# Altium footprint library 我的器件.PCBLIB: 450 footprints (part 28 of 29)
Each footprint in its own frame and in the unit in brackets; x right, y up, seen from the top. Pads: shape width x height; smd on the part's side, far side on the other; paste and mask are expansions set on the pad; w line width, h text height; cw(c..) or ccw(c..) is an arc to the next point about the centre after c.
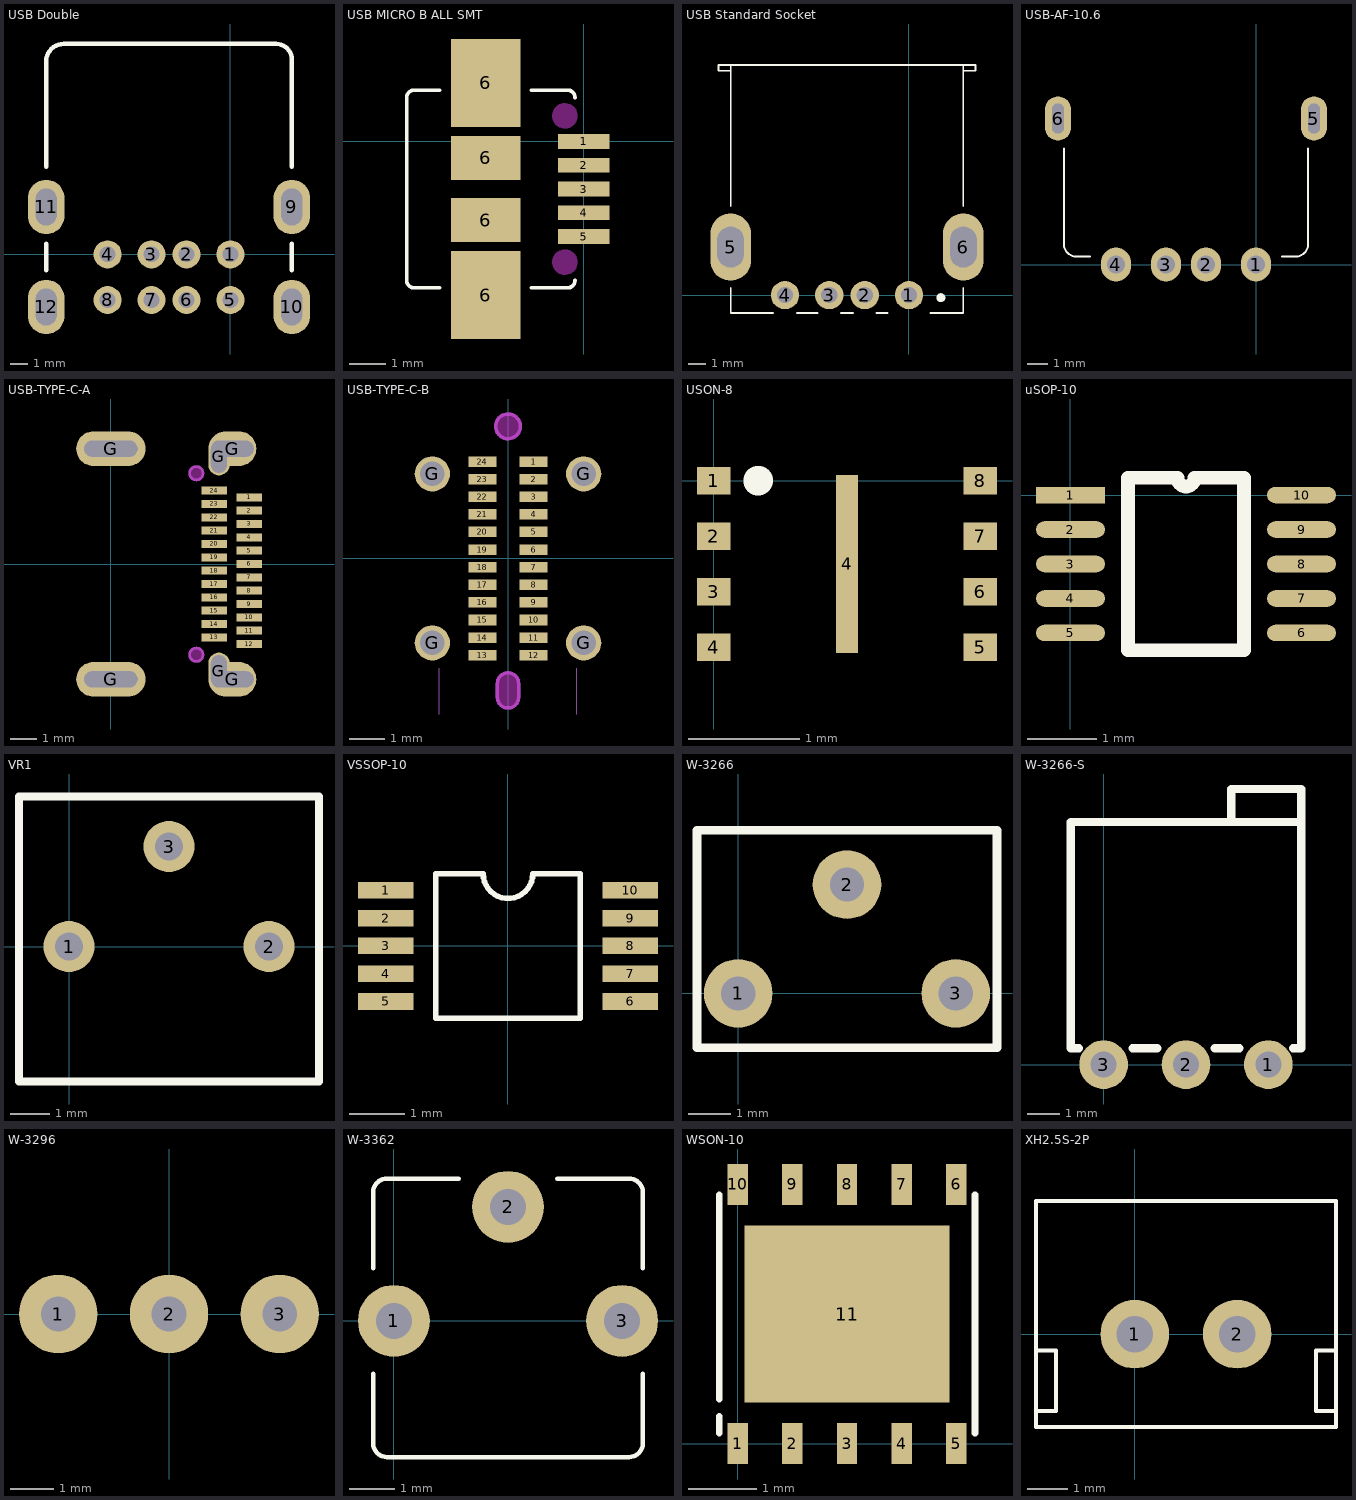
[diagram p27: the footprints below, top view; thin cyan lines are the x and y axes]

## USB Double [mm]
pads (12):
  round 1.6 hole 0.9: 1(0,0) 2(-2.5,0) 3(-4.5,0) 4(-7,0) 5(0,-2.6) 6(-2.5,-2.6) 7(-4.5,-2.6) 8(-7,-2.6)
  oval 2.1x3.1 hole 1.2 slot 2.1 at 90 deg: 9(3.5,2.7) 10(3.5,-3) 11(-10.5,2.7) 12(-10.5,-3)
Top Overlay:
  lines w0.254: -10.5,-0.9 -10.5,0.6 ; -10.5,5 -10.5,11 cw(c-9.5,11) -9.5,12 2.6,12 cw(c2.6,11.1) 3.5,11.1 3.5,5 ; 3.5,-0.9 3.5,0.6
3D body: height 0.6, standoff -2, extent 3.35,-3.8 3.65,-2.2
3D body: height 0.6, standoff -2, extent 3.35,1.9 3.65,3.5
3D body: height 0.6, standoff -2, extent -10.65,-3.8 -10.35,-2.2
3D body: height 0.6, standoff -2, extent -0.25,-0.1 0.25,0.1
3D body: height 0.6, standoff -2, extent -2.75,-0.1 -2.25,0.1
3D body: height 0.6, standoff -2, extent -4.75,-0.1 -4.25,0.1
3D body: height 0.6, standoff -2, extent -7.25,-0.1 -6.75,0.1
3D body: height 0.6, standoff -2, extent -0.25,-2.7 0.25,-2.5
3D body: height 0.6, standoff -2, extent -2.75,-2.7 -2.25,-2.5
3D body: height 0.6, standoff -2, extent -4.75,-2.7 -4.25,-2.5
3D body: height 0.6, standoff -2, extent -10.65,1.9 -10.35,3.5
3D body: height 4.1, standoff 3.6, extent -7.5,4.45 -6.5,10.45
3D body: height 6.1, standoff 4.1, extent -9,3.15 2,12.15
3D body: height 4.1, standoff 3.6, extent -5,4.45 -4,10.45
3D body: height 4.1, standoff 3.6, extent -3,4.45 -2,10.45
3D body: height 4.1, standoff 3.6, extent -0.5,4.45 0.5,10.45
3D body: height 12.8, standoff 12.3, extent -0.5,4.45 0.5,10.45
3D body: height 12.8, standoff 12.3, extent -3,4.45 -2,10.45
3D body: height 12.8, standoff 12.3, extent -5,4.45 -4,10.45
3D body: height 0.6, standoff 0, extent 0.5,5.05 1.5,10.35
3D body: height 0.6, standoff 0, extent -8.5,5.05 -7.5,10.35
3D body: height 17.1, standoff 0.6, extent 3.1,0.85 4.2,12.85
3D body: height 10.1, standoff 7.1, extent -11.2,0.85 4.2,12.85
3D body: height 17.1, standoff 15.8, extent -11.2,0.85 4.2,12.85
3D body: height 0.6, standoff -2, extent -7.25,-2.7 -6.75,-2.5
3D body: height 17.1, standoff 17, extent -11.2,-4.35 4.2,12.85
3D body: height 0.7, standoff 0.6, extent -11.2,-4.35 4.2,12.85
3D body: height 17.1, standoff 0.6, extent -11.2,-4.35 -11.1,12.85
3D body: height 17.1, standoff 0.6, extent 4.1,-4.35 4.2,12.85
3D body: height 17.1, standoff 0.6, extent -11.2,-4.35 4.2,-4.25
3D body: height 1.6, standoff 0.6, extent -11.2,0.85 4.2,12.85
3D body: height 17.1, standoff 0.6, extent -11.2,0.85 -10.1,12.85
3D body: height 17, standoff 0.7, extent -11.1,-4.25 4.1,4.85
3D body: height 14.8, standoff 12.8, extent -9,3.15 2,12.15
3D body: height 12.8, standoff 12.3, extent -7.5,4.45 -6.5,10.45
3D body: height 0.6, standoff 0.5, extent -8.5,-3.85 1.5,1.35

## USB MICRO B ALL SMT [mm]
pads (9):
  rect 1.4x0.4 smd: 1(0,0) 2(0,-0.65) 4(0,-1.95) 5(0,-2.6)
  rect 1.4x0.4 smd paste+0: 3(0,-1.3)
  rect 1.9x2.4 smd: 6(-2.675,-4.2) 6(-2.675,1.6)
  rect 1.9x1.2 smd: 6(-2.675,-2.15) 6(-2.675,-0.45)
Top Overlay:
  lines w0.1: -3.938,-4 -4.638,-4 cw(c-4.638,-3.8) -4.838,-3.8 -4.838,1.2 cw(c-4.638,1.2) -4.638,1.4 -3.938,1.4 ; -1.438,-4 -0.437,-4 ccw(c-0.437,-3.8) -0.238,-3.8 ; -1.438,1.4 -0.437,1.4 cw(c-0.437,1.2) -0.238,1.2
Keep-Out Layer:
  circle w0.1: c-0.513,0.7 r0.3
  circle w0.1: c-0.513,-3.3 r0.3
  board cut-out: -0.513,0.4 -0.453,0.4 -0.343,0.446 -0.258,0.53 -0.212,0.64 -0.213,0.7 -0.213,0.76 -0.258,0.87 -0.343,0.954 -0.453,1 -0.512,1 -0.572,1 -0.682,0.954 -0.767,0.87 -0.813,0.76 -0.813,0.7 -0.813,0.64 -0.767,0.53 -0.682,0.446 -0.572,0.4
  board cut-out: -0.513,-3 -0.453,-3 -0.343,-3.046 -0.258,-3.13 -0.213,-3.24 -0.213,-3.3 -0.213,-3.36 -0.258,-3.47 -0.343,-3.554 -0.453,-3.6 -0.513,-3.6 -0.572,-3.6 -0.682,-3.554 -0.767,-3.47 -0.813,-3.36 -0.813,-3.3 -0.813,-3.24 -0.767,-3.13 -0.682,-3.046 -0.572,-3
3D body "473460001.stp": height 2.72, standoff -0.22, extent -5.267,-5.29 0.163,2.69

## USB Standard Socket [mm]
pads (6):
  round 1.6 hole 0.92: 1(0,0) 2(-2.5,0) 3(-4.5,0) 4(-7,0)
  oval 2.3x3.8 hole 1.5 slot 2.3 at 90 deg: 5(-10.07,2.71) 6(3.07,2.71)
Top Overlay:
  circle w0.25: c1.8,-0.145 r0.125
  lines w0.1: -10.065,0.41 -10.065,-1.01 -7.66,-1.01 ; -10.065,5.01 -10.065,12.99 ; -10.065,12.67 -10.75,12.67 -10.75,12.99 -10.065,12.99 ; -6.34,-1.01 -5.16,-1.01 ; -3.84,-1.01 -3.16,-1.01 ; -1.84,-1.01 -1.2,-1.01 ; 1.2,-1.01 3.065,-1.01 3.065,0.41 ; 3.065,5.01 3.065,12.99 ; 3.065,12.67 3.75,12.67 3.75,12.99 3.065,12.99 ; -10.065,12.99 3.065,12.99
3D body: height 0.2, standoff -2, extent -0.25,-0.1 0.25,0.1
3D body: height 0.2, standoff -2, extent -2.75,-0.1 -2.25,0.1
3D body: height 0.2, standoff -2, extent -4.75,-0.1 -4.25,0.1
3D body: height 0.2, standoff -2, extent -7.25,-0.1 -6.75,0.1
3D body: height 0.2, standoff -2, extent -10.1,1.755 -9.8,3.755
3D body: height 0.2, standoff -2, extent 2.8,1.755 3.1,3.755
3D body: height 7.7, standoff 6.7, extent -9.6,12.655 2.6,12.955
3D body: height 7, standoff 6.7, extent -10.1,-1.045 3.1,12.655
3D body: height 2.1, standoff 0.7, extent -9.6,12.655 2.6,12.955
3D body: height 1.7, standoff 1.4, extent -10.1,-1.045 3.1,12.655
3D body: height 6, standoff 2.4, extent -10.8,12.655 -9.8,12.955
3D body: height 6, standoff 2.4, extent 2.8,12.655 3.8,12.955
3D body: height 7, standoff 1.4, extent -10.1,4.955 -9.8,12.655
3D body: height 7, standoff 1.4, extent 2.8,4.955 3.1,12.655
3D body: height 7, standoff 0.1, extent -10.1,-1.045 -9.8,4.955
3D body: height 7, standoff 0.1, extent 2.8,-1.045 3.1,4.955
3D body: height 6.6, standoff 0.1, extent -9.8,-0.745 2.8,4.955
3D body: height 6.3, standoff 4.8, extent -8.9,2.355 1.9,12.355
3D body: height 7, standoff 0.1, extent -10.1,-1.045 3.1,-0.745

## USB-AF-10.6 [mm]
pads (6):
  oval 1.5x1.7 hole 0.92: 1(0,0) 2(-2.5,0) 3(-4.5,0) 4(-7,0)
  oval 1.3x2.2 hole 0.6 slot 1.5 at 90 deg: 5(2.9,7.3) 6(-9.9,7.3)
Top Overlay:
  lines w0.1: -9.6,5.8 -9.6,1 ccw(c-9,1) -9,0.4 -8.3,0.4 ; 1.3,0.4 2,0.4 ccw(c2,1) 2.6,1 2.6,5.8
3D body: height 0.5, standoff -2, extent 2.75,6.7 3.05,7.9
3D body: height 0.5, standoff -2, extent -10.05,6.7 -9.75,7.9
3D body: height 6.2, standoff 0.5, extent 2.8,2.9 3.1,10.5
3D body: height 6.2, standoff 0.5, extent -10.1,2.9 -9.8,10.5
3D body: height 0.8, standoff 0.5, extent -3.5,0.1 3.1,10.5
3D body: height 0.8, standoff 0.5, extent -10.1,0.1 -3.5,10.5
3D body: height 6.2, standoff 5.9, extent -3.5,-0.1 3.8,10.5
3D body: height 6.2, standoff 5.9, extent -10.8,-0.1 -3.5,10.5
3D body: height 4.2, standoff -2, extent -7.3,-0.1 -6.7,0.1
3D body: height 4.2, standoff -2, extent -4.8,-0.1 -4.2,0.1
3D body: height 4.2, standoff -2, extent -2.8,-0.1 -2.2,0.1
3D body: height 4.2, standoff -2, extent -0.3,-0.1 0.3,0.1
3D body: height 5.9, standoff 0, extent -10.8,-0.1 3.8,2.9
3D body: height 0.5, standoff -0.1, extent -9.2,10.2 -3.5,10.5
3D body: height 0.5, standoff -0.1, extent -3.5,10.2 2.2,10.5
3D body: height 6.6, standoff 6.2, extent -9.2,10.2 -3.5,10.5
3D body: height 6.6, standoff 6.2, extent -3.5,10.2 2.2,10.5
3D body: height 5.7, standoff 1, extent -10.65,10.2 -10.1,10.5
3D body: height 5.7, standoff 1, extent 3.1,10.2 3.65,10.5
3D body: height 5, standoff 3, extent -9,2.9 2,9.7
3D body: height 3, standoff 2.8, extent -7.5,2.9 -6.5,8.4
3D body: height 3, standoff 2.8, extent -5,2.9 -4,8.4
3D body: height 3, standoff 2.8, extent -3,2.9 -2,8.4
3D body: height 3, standoff 2.8, extent -0.5,2.9 0.5,8.4

## USB-TYPE-C-A [mm]
pads (30):
  rect 0.95x0.3 smd: 1(5.18,2.5) 2(5.18,2) 3(5.18,1.5) 4(5.18,1) 5(5.18,0.5) 6(5.18,0) 7(5.18,-0.5) 8(5.18,-1) 9(5.18,-1.5) 10(5.18,-2) 11(5.18,-2.5) 12(5.18,-3) 13(3.87,-2.75) 14(3.87,-2.25) 15(3.87,-1.75) 16(3.87,-1.25) 17(3.87,-0.75) 18(3.87,-0.25) 19(3.87,0.25) 20(3.87,0.75) 21(3.87,1.25) 22(3.87,1.75) 23(3.87,2.25) 24(3.87,2.75)
  oval 2.6x1.3 hole 0.6 slot 2 at 0 deg: G(0,-4.32) G(0,4.32)
  oval 0.8x1.4 hole 0.6 slot 1.2 at 90 deg: G(4.05,-4.02) G(4.05,4.02)
  oval 1.8x1.3 hole 0.6 slot 1.6 at 0 deg: G(4.55,-4.32) G(4.55,4.32)
Keep-Out Layer:
  circle w0.1: c3.2,-3.4 r0.25
  circle w0.1: c3.2,3.4 r0.25
  board cut-out: 3.2,-3.65 3.25,-3.65 3.342,-3.612 3.412,-3.542 3.45,-3.45 3.45,-3.4 3.45,-3.35 3.412,-3.258 3.342,-3.188 3.25,-3.15 3.2,-3.15 3.15,-3.15 3.058,-3.188 2.988,-3.258 2.95,-3.35 2.95,-3.4 2.95,-3.45 2.988,-3.542 3.058,-3.612 3.15,-3.65 3.2,-3.65
  board cut-out: 3.2,3.65 3.25,3.65 3.342,3.612 3.412,3.542 3.45,3.45 3.45,3.4 3.45,3.35 3.412,3.258 3.342,3.188 3.25,3.15 3.2,3.15 3.15,3.15 3.058,3.188 2.988,3.258 2.95,3.35 2.95,3.4 2.95,3.45 2.988,3.542 3.058,3.612 3.15,3.65 3.2,3.65
Mechanical 2:
  circle w0.1: c3.2,3.4 r0.25
  circle w0.1: c3.2,-3.4 r0.25
3D body "PCB1.step": height 3.16, standoff -0.6, extent -2.7,-4.47 5.2,4.47

## USB-TYPE-C-B [mm] "High 9.3mm"
pads (28):
  rect 0.8x0.3 smd: 1(0.725,2.75) 2(0.725,2.25) 3(0.725,1.75) 4(0.725,1.25) 5(0.725,0.75) 6(0.725,0.25) 7(0.725,-0.25) 8(0.725,-0.75) 9(0.725,-1.25) 10(0.725,-1.75) 11(0.725,-2.25) 12(0.725,-2.75) 13(-0.725,-2.75) 14(-0.725,-2.25) 15(-0.725,-1.75) 16(-0.725,-1.25) 17(-0.725,-0.75) 18(-0.725,-0.25) 19(-0.725,0.25) 20(-0.725,0.75) 21(-0.725,1.25) 22(-0.725,1.75) 23(-0.725,2.25) 24(-0.725,2.75)
  round 1 hole 0.7: G(-2.15,-2.4) G(-2.15,2.4) G(2.15,-2.4) G(2.15,2.4)
Keep-Out Layer:
  circle w0.1: c0,3.75 r0.35
  board cut-out: 0,-3.25 -0.06,-3.25 -0.17,-3.296 -0.254,-3.38 -0.3,-3.49 -0.3,-3.55 -0.3,-3.95 -0.3,-4.01 -0.254,-4.12 -0.17,-4.204 -0.06,-4.25 0,-4.25 0.06,-4.25 0.17,-4.204 0.254,-4.12 0.3,-4.01 0.3,-3.95 0.3,-3.55 0.3,-3.49 0.254,-3.38 0.17,-3.296 0.06,-3.25
  board cut-out: 0,4.1 0.07,4.1 0.198,4.047 0.297,3.948 0.35,3.82 0.35,3.75 0.35,3.68 0.297,3.552 0.198,3.453 0.07,3.4 0,3.4 -0.07,3.4 -0.198,3.453 -0.297,3.552 -0.35,3.68 -0.35,3.75 -0.35,3.82 -0.297,3.948 -0.198,4.047 -0.07,4.1
  lines w0.1: -0.3,-3.95 ccw(c0,-3.95) 0.3,-3.95 0.3,-3.55 ccw(c0,-3.55) -0.3,-3.55 -0.3,-3.95
Mechanical 1:
  lines w0.01: -1.95,-4.42 -1.95,-3.12 ; 1.95,-4.42 1.95,-3.12
Mechanical 2:
  circle w0.1: c0,3.75 r0.35
  lines w0.1: -0.3,-3.95 ccw(c0,-3.95) 0.3,-3.95 0.3,-3.55 ccw(c0,-3.55) -0.3,-3.55 -0.3,-3.95
3D body: height 6.3, standoff 4.3, extent -0.6,-3.5 0.6,3.5
3D body: height 4.3, standoff 2, extent -1.28,-4.17 1.28,4.17
3D body: height 9.3, standoff 2, extent -1.58,-4.47 1.58,4.47
3D body: height 2, standoff 0, extent -1.95,-4.42 1.95,4.42
3D body: height 9, standoff 2, extent -0.35,0 0.35,3.25
3D body: height 9, standoff 2, extent -0.35,-3.25 0.35,0

## USON-8 [mm]
pads (9):
  rect 0.3x0.25 smd: 1(0,0) 2(0,-0.5) 3(0,-1) 4(0,-1.5) 5(2.4,-1.5) 6(2.4,-1) 7(2.4,-0.5) 8(2.4,0)
  rect 0.2x1.6 smd: 4(1.2,-0.75)
Top Overlay:
  circle w0.254: c0.4,0 r0.006
3D body: height 0.56, standoff 0.55, extent -0.075,-0.275 0.223,0.025
3D body: height 0.2, standoff 0, extent 1.1,-1.55 1.3,0.05
3D body: height 0.2, standoff 0, extent 2.25,-1.125 2.55,-0.875
3D body: height 0.2, standoff 0, extent 2.25,-0.625 2.55,-0.375
3D body: height 0.2, standoff 0, extent 2.25,-0.125 2.55,0.125
3D body: height 0.2, standoff 0, extent 2.25,-1.625 2.55,-1.375
3D body: height 0.2, standoff 0, extent -0.15,-0.125 0.15,0.125
3D body: height 0.2, standoff 0, extent -0.15,-1.625 0.15,-1.375
3D body: height 0.2, standoff 0, extent -0.15,-1.125 0.15,-0.875
3D body: height 0.2, standoff 0, extent -0.15,-0.625 0.15,-0.375
3D body: height 0.55, standoff 0.01, extent -0.3,-1.75 2.7,0.25

## uSOP-10 [mm]
pads (10):
  rect 1x0.24 smd: 1(0,0)
  oval 1x0.24 smd: 2(0,-0.5) 3(0,-1) 4(0,-1.5) 5(0,-2) 6(3.35,-2) 7(3.35,-1.5) 8(3.35,-1) 9(3.35,-0.5) 10(3.35,0)
Top Overlay:
  lines w0.2: 0.835,-2.25 0.835,0.25 1.55,0.25 ccw(c1.675,0.25) 1.8,0.25 2.515,0.25 2.515,-2.25 0.835,-2.25

## VR1 [mm]
pads (3):
  round 1.3 hole 0.7: 1(0,0) 2(5.08,0) 3(2.54,2.54)
Top Overlay:
  lines w0.2: -1.27,-3.429 -1.27,3.81 6.35,3.81 6.35,-3.429 -1.27,-3.429

## VSSOP-10 [mm]
pads (10):
  rect 1x0.3 smd: 1(-2.2,1) 2(-2.2,0.5) 3(-2.2,0) 4(-2.2,-0.5) 5(-2.2,-1) 6(2.2,-1) 7(2.2,-0.5) 8(2.2,0) 9(2.2,0.5) 10(2.2,1)
Top Overlay:
  lines w0.1: -1.3,-1.3 1.3,-1.3 1.3,1.3 0.447,1.3 cw(c0,1.3) -0.447,1.3 -1.3,1.3 -1.3,1.2 -1.3,-1.3
3D body: height 1.11, standoff 1.1, extent -1.199,0.6 -0.6,1.2
3D body: height 0.7, standoff 0.5, extent -1.8,0.875 -1.2,1.125
3D body: height 0.7, standoff 0, extent -2,0.875 -1.8,1.125
3D body: height 0.18, standoff 0, extent -2.5,0.875 -1.9,1.125
3D body: height 0.7, standoff 0.5, extent -1.8,0.375 -1.2,0.625
3D body: height 0.7, standoff 0, extent -2,0.375 -1.8,0.625
3D body: height 0.18, standoff 0, extent -2.5,0.375 -1.9,0.625
3D body: height 0.7, standoff 0.5, extent -1.8,-0.125 -1.2,0.125
3D body: height 0.7, standoff 0, extent -2,-0.125 -1.8,0.125
3D body: height 0.18, standoff 0, extent -2.5,-0.125 -1.9,0.125
3D body: height 0.7, standoff 0.5, extent -1.8,-0.625 -1.2,-0.375
3D body: height 0.7, standoff 0, extent -2,-0.625 -1.8,-0.375
3D body: height 0.18, standoff 0, extent -2.5,-0.625 -1.9,-0.375
3D body: height 0.7, standoff 0.5, extent -1.8,-1.125 -1.2,-0.875
3D body: height 0.7, standoff 0, extent -2,-1.125 -1.8,-0.875
3D body: height 0.18, standoff 0, extent -2.5,-1.125 -1.9,-0.875
3D body: height 0.7, standoff 0.5, extent 1.2,0.875 1.8,1.125
3D body: height 0.7, standoff 0, extent 1.8,0.875 2,1.125
3D body: height 0.18, standoff 0, extent 1.9,0.875 2.5,1.125
3D body: height 0.7, standoff 0.5, extent 1.2,0.375 1.8,0.625
3D body: height 0.7, standoff 0, extent 1.8,0.375 2,0.625
3D body: height 0.18, standoff 0, extent 1.9,0.375 2.5,0.625
3D body: height 0.7, standoff 0.5, extent 1.2,-0.125 1.8,0.125
3D body: height 0.7, standoff 0, extent 1.8,-0.125 2,0.125
3D body: height 0.18, standoff 0, extent 1.9,-0.125 2.5,0.125
3D body: height 0.7, standoff 0.5, extent 1.2,-0.625 1.8,-0.375
3D body: height 0.7, standoff 0, extent 1.8,-0.625 2,-0.375
3D body: height 0.18, standoff 0, extent 1.9,-0.625 2.5,-0.375
3D body: height 0.18, standoff 0, extent 1.9,-1.125 2.5,-0.875
3D body: height 0.7, standoff 0, extent 1.8,-1.125 2,-0.875
3D body: height 0.7, standoff 0.5, extent 1.2,-1.125 1.8,-0.875
3D body: height 1.1, standoff 0.1, extent -1.5,-1.5 1.5,1.5

## W-3266 [mm]
pads (3):
  round 1.6 hole 0.8: 1(0,0) 2(2.54,2.54) 3(5.08,0)
Top Overlay:
  lines w0.2: -0.96,-1.27 6.04,-1.27 6.04,3.81 -0.96,3.81 -0.96,-1.27

## W-3266-S [mm] "Body 7X7mm"
height 5
pads (3):
  round 1.5 hole 0.8: 1(5.08,0) 2(2.54,0) 3(0,0)
Top Overlay:
  lines w0.254: -0.762,0.508 -1.016,0.508 -1.016,7.493 5.969,7.493 ; 0.889,0.508 1.651,0.508 ; 3.429,0.508 4.191,0.508 ; 3.937,7.493 3.937,8.509 6.096,8.509 6.096,7.493 6.096,0.508 5.842,0.508

## W-3296 [mm]
height 11
pads (3):
  round 1.8 hole 0.8: 1(-2.54,0) 2(0,0) 3(2.54,0)
3D body: height 3, standoff -2, extent 2.292,-0.249 2.79,0.25
3D body: height 3, standoff -2, extent -0.248,-0.249 0.25,0.25
3D body: height 3, standoff -2, extent -2.788,-0.249 -2.29,0.25
3D body: height 10, standoff 0.5, extent -4.75,-1.9 4.75,2.6
3D body: height 1, standoff 0, extent -4.75,-2.4 -3.95,2.6
3D body: height 1, standoff 0, extent 3.95,-2.4 4.75,2.6
3D body: height 10, standoff 9, extent -4.75,-2.4 -3.95,2.6
3D body: height 10, standoff 9, extent 3.95,-2.4 4.75,2.6
3D body: height 11.6, standoff 10, extent -4.75,0.404 -2.559,2.6
3D body: height 11.61, standoff 11, extent -4.75,1.252 -2.55,1.752

## W-3362 [mm]
pads (3):
  round 1.6 hole 0.8: 1(0,0) 2(2.54,2.54) 3(5.08,0)
Top Overlay:
  lines w0.1: -0.46,-1.17 -0.46,-2.73 ccw(c-0.16,-2.73) -0.16,-3.03 5.24,-3.03 ccw(c5.24,-2.73) 5.54,-2.73 5.54,-1.17 ; -0.46,1.17 -0.46,2.87 cw(c-0.16,2.87) -0.16,3.17 1.44,3.17 ; 3.64,3.17 5.24,3.17 cw(c5.24,2.87) 5.54,2.87 5.54,1.17
3D body: height 4.7, standoff 0.33, extent -0.76,-3.225 5.84,3.475
3D body: height 4.2, standoff 0.33, extent -0.76,-3.375 5.84,-3.225
3D body: height 4.2, standoff 0.33, extent 0.24,-3.525 1.24,-3.375
3D body: height 4.2, standoff 0.33, extent 3.84,-3.525 4.84,-3.375
3D body: height 4.71, standoff 1, extent 0.615,-1.811 4.48,2.061
3D body: height 4.72, standoff 3, extent 0.655,-0.125 4.455,0.375
3D body: height 4.72, standoff 3, extent 2.298,-1.771 2.798,2.029
3D body: height 4.71, standoff 1, extent 0.655,-1.771 4.44,2.021
3D body: height 4.71, standoff 1, extent -0.157,-2.824 0.44,-2.225
3D body: height 1, standoff -2, extent -0.297,-0.299 0.3,0.3
3D body: height 1, standoff -2, extent 2.243,2.241 2.84,2.84
3D body: height 1, standoff -2, extent 4.783,-0.299 5.38,0.3
3D body: height 0.33, standoff 0, extent -0.76,-3.225 -0.16,-2.625
3D body: height 0.33, standoff 0, extent 5.24,-3.225 5.84,-2.625
3D body: height 0.33, standoff 0, extent 5.24,2.875 5.84,3.475
3D body: height 0.33, standoff 0, extent -0.76,2.875 -0.16,3.475

## WSON-10 [mm]
pads (11):
  rect 0.3x0.6 smd: 1(0,0) 2(0.8,0) 3(1.6,0) 4(2.4,0) 5(3.2,0) 6(3.2,3.8) 7(2.4,3.8) 8(1.6,3.8) 9(0.8,3.8) 10(0,3.8)
  rect 3x2.6 smd: 11(1.6,1.9)
Top Overlay:
  lines w0.1: -0.275,0.15 -0.275,0.4 ; -0.275,0.65 -0.275,3.65 ; 3.475,0.15 3.475,3.65
3D body: height 0.1, standoff 0, extent -0.15,3.625 0.15,3.925
3D body: height 0.1, standoff 0, extent 0.65,3.625 0.95,3.925
3D body: height 0.1, standoff 0, extent 1.45,3.625 1.75,3.925
3D body: height 0.1, standoff 0, extent 2.25,3.625 2.55,3.925
3D body: height 0.1, standoff 0, extent 3.05,3.625 3.35,3.925
3D body: height 0.1, standoff 0, extent 3.05,-0.125 3.35,0.175
3D body: height 0.1, standoff 0, extent 2.25,-0.125 2.55,0.175
3D body: height 0.1, standoff 0, extent 1.45,-0.125 1.75,0.175
3D body: height 0.1, standoff 0, extent 0.65,-0.125 0.95,0.175
3D body: height 0.81, standoff 0, extent -0.15,0.15 0.45,0.75
3D body: height 0.1, standoff 0, extent -0.15,-0.125 0.15,0.175
3D body: height 0.8, standoff 0, extent -0.4,-0.1 3.6,3.9

## XH2.5S-2P [mm]
pads (2):
  round 1.7 hole 0.9: 1(0,0) 2(2.54,0)
Top Overlay:
  lines w0.1: -2.45,-1.9 -1.95,-1.9 -1.95,-0.4 -2.45,-0.4 ; 4.99,-1.9 4.49,-1.9 4.49,-0.4 4.99,-0.4 ; -2.45,-2.3 4.99,-2.3 4.99,3.3 -2.45,3.3 -2.45,-2.3
3D body: height 7, standoff 0, extent 2.515,-2.55 5.215,-1.85
3D body: height 3, standoff 0, extent 4.515,-1.85 5.215,-0.45
3D body: height 7, standoff 0, extent 4.515,-0.45 5.215,3.55
3D body: height 7, standoff 0, extent -2.675,-0.45 -1.975,3.55
3D body: height 7, standoff 0, extent -2.675,2.85 5.215,3.55
3D body: height 7, standoff 0, extent -2.675,-2.55 0.025,-1.85
3D body: height 3, standoff 0, extent -2.675,-1.85 -1.975,-0.45
3D body: height 1, standoff 0, extent -2.675,-2.55 5.215,3.55
3D body: height 3, standoff 0, extent 0.025,-2.55 2.515,-1.85
3D body: height 6, standoff -2, extent -0.4,-0.4 0.397,0.398
3D body: height 6, standoff -2, extent 2.14,-0.4 2.937,0.398